# Altium schematic symbol library Minh_Lib.SchLib: 619 symbols (part 1 of 4) (continued)
## C0805C122K4RACTU
designator C?  Supplier Part Number 1: 80-C0805C122K4R
Cap Ceramic 0.0012uF/1200pF 16V X7R 10% SMD 0805 Paper T/R; Manufacturer: KEMET; Manufacturer Part Number: C0805C122K4RACTU; Capacitance: 1.2nF; Dissipation Factor: 5%; Supplier 1: Mouser; RoHS: Yes; Category: Ceramic Capacitors; Pricing 1: 1=0.25000, 10=0.17200, 50=0.17200, 100=0.09800, 1000=0.06100, 10000=0.04300 (USD); Mount: Surface Mount; Case/Package: 0805; Case Code (Imperial): 0805; Case Code (Metric): 2012; Dielectric Material: Ceramic; Min Operating Temperature: -55°C; Max Operating Temperature: 125°C; Package Quantity: 4000; Tolerance: 10%; Packaging: Tape and Reel; Voltage Rating: 16V; Voltage Rating (DC): 16V; Dielectric: X7R; Termination: SMD/SMT; Series: C; Length: 2mm; Width: 1.2mm; Height: 0.78mm; Lead Pitch: 0.75mm; Thickness: 0.035inch; Depth: 1.25mm; RoHS Compliant: Yes; ComponentLink1URL: http://www.mouser.com/ds/2/212/KEM_C1002_X7R_SMD-1102033.pdf?src-supplier=Mouser; ComponentLink1Description: http://www.mouser.com/ds/2/212/KEM_C1002_X7R_SMD-1102033.pdf?src-supplier=Mouser; ComponentLink2URL: https://search.kemet.com/component-edge/download/datasheet/C0805C122K4RACTU.pdf?src-supplier=Digi-Key; ComponentLink2Description: https://search.kemet.com/component-edge/download/datasheet/C0805C122K4RACTU.pdf?src-supplier=Digi-Key
footprint CAP0805
pins: 1, 2

## C0805C122K5RACTU
designator C?  Supplier Part Number 1: 66AH5612
Cap Ceramic 0.0012uF 50V X7R 10% SMD 0805 125C Plastic T/R; Manufacturer: KEMET; Manufacturer Part Number: C0805C122K5RACTU; Capacitance: 1.2nF; Dissipation Factor: 2.5%; Supplier 1: Newark; RoHS: Yes; Category: Ceramic Capacitors; Stock 1: 12000; Pricing 1: 4000=0.05700 (USD); Mount: Surface Mount; Case/Package: 0805; Dielectric Material: Ceramic; Case Code (Metric): 2012; Case Code (Imperial): 0805; Min Operating Temperature: -55°C; Max Operating Temperature: 125°C; Tolerance: 10%; Dielectric: X7R; Voltage Rating (DC): 50V; Packaging: Tape and Reel; Package Quantity: 1; Voltage Rating: 50V; Termination: SMD/SMT; Length: 2mm; Width: 0.049inch; Height: 0.78mm; Depth: 1.25mm; Thickness: 0.035inch; Lead Pitch: 0.75mm; Radiation Hardening: No; REACH SVHC: No SVHC; ComponentLink1URL: http://components.arrow.com/part/dataview/2091237S5303768N7429?src-supplier=Arrow+Electronics; ComponentLink1Description: http://components.arrow.com/part/dataview/2091237S5303768N7429?src-supplier=Arrow+Electronics; ComponentLink2URL: https://www.verical.com/server-webapp/html/getDatasheet?partID=548515&src-supplier=Verical; ComponentLink2Description: https://www.verical.com/server-webapp/html/getDatasheet?partID=548515&src-supplier=Verical; ComponentLink3URL: http://components.arrow.com/part/dataview/0323_00327402?src-supplier=Arrow+Europe; ComponentLink3Description: http://components.arrow.com/part/dataview/0323_00327402?src-supplier=Arrow+Europe; ComponentLink4URL: http://www.mouser.com/ds/2/212/KEM_C1002_X7R_SMD-1102033.pdf?src-supplier=Mouser; ComponentLink4Description: http://www.mouser.com/ds/2/212/KEM_C1002_X7R_SMD-1102033.pdf?src-supplier=Mouser; ComponentLink5URL: https://search.kemet.com/component-edge/download/datasheet/C0805C122K5RACTU.pdf?src-supplier=Digi-Key; ComponentLink5Description: https://search.kemet.com/component-edge/download/datasheet/C0805C122K5RACTU.pdf?src-supplier=Digi-Key; ComponentLink6URL: https://api.kemet.com/component-edge/download/datasheet/C0805C122K5RACTU.pdf?src-supplier=Digi-Key; ComponentLink6Description: https://api.kemet.com/component-edge/download/datasheet/C0805C122K5RACTU.pdf?src-supplier=Digi-Key; ComponentLink7URL: http://www.kemet.com/kemet/web/homepage/kechome.nsf/weben/C4DA2DA1D1C9D3C3CA2570A50016092D/$file/KEM_C1002_X7R_SMD.pdf?src-supplier=Avnet+Europe; ComponentLink7Description: http://www.kemet.com/kemet/web/homepage/kechome.nsf/weben/C4DA2DA1D1C9D3C3CA2570A50016092D/$file/KEM_C1002_X7R_SMD.pdf?src-supplier=Avnet+Europe; ComponentLink8URL: http://www.farnell.com/datasheets/2746341.pdf?src-supplier=Newark; ComponentLink8Description: http://www.farnell.com/datasheets/2746341.pdf?src-supplier=Newark
footprint CAP0805
pins: 1, 2

## C0805C122K8HACAUTO
designator C?  Supplier Part Number 1: 80-C0805C122K8HAUTO
Ceramic Capacitors - SMD/SMT 10V 1200pF X8R 0805 10% AEC-Q200; Manufacturer: KEMET; Manufacturer Part Number: C0805C122K8HACAUTO; Supplier 1: Mouser; RoHS: Yes; Category: Ceramic Capacitors; Pricing 1: 1=0.16000, 10=0.11300, 50=0.11300, 100=0.05400, 1000=0.03100, 10000=0.02400 (USD); RoHS Compliant: Yes
footprint CAP0805
pins: 1, 2

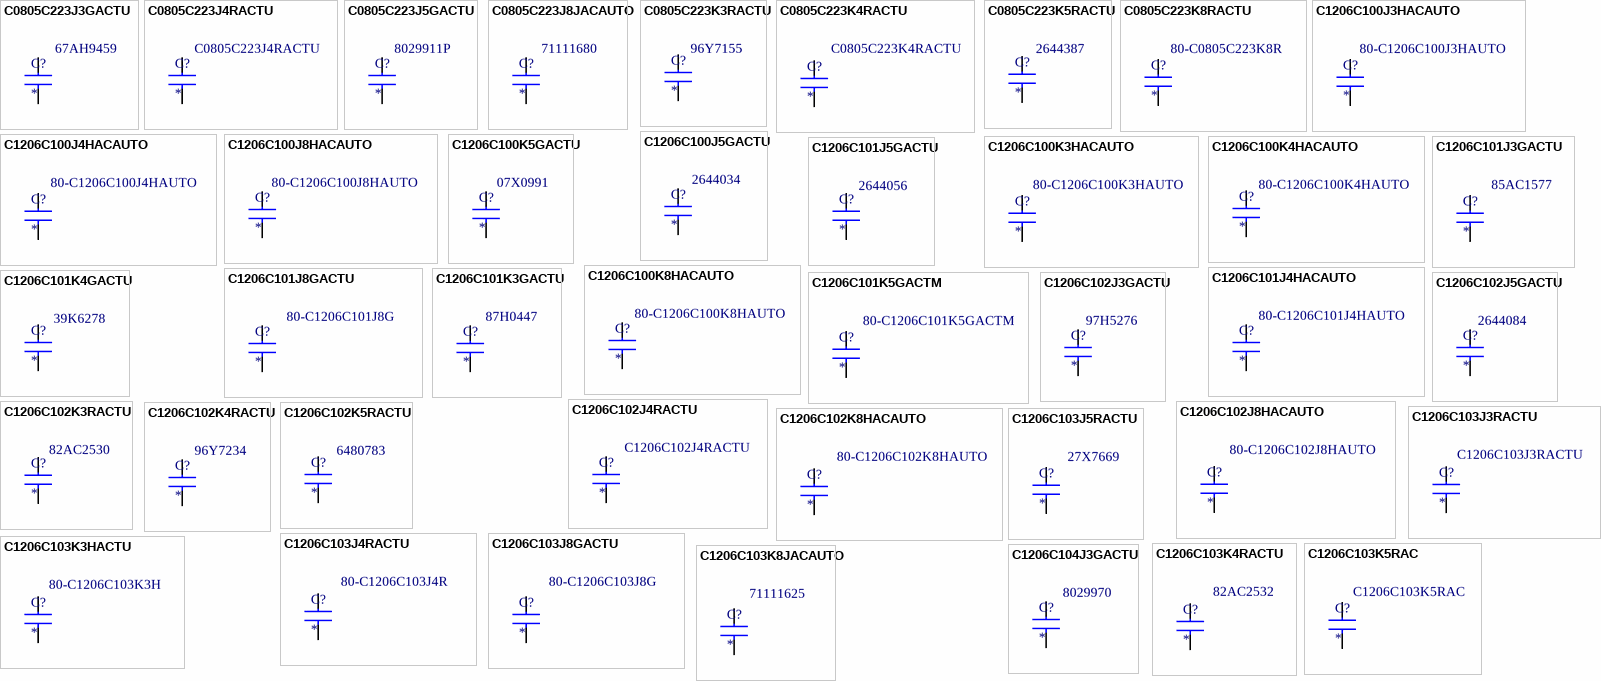
[diagram p2: symbols C0805C223J3GACTU to C1206C104J3GACTU]

## C0805C223J3GACTU
designator C?  Supplier Part Number 1: 67AH9459
Cap Ceramic 0.022uF 25V C0G 5% SMD 0805 125°C Paper T/R; Manufacturer: KEMET; Manufacturer Part Number: C0805C223J3GACTU; Capacitance: 22nF; Dissipation Factor: 0.1%; Supplier 1: Newark; RoHS: Yes; Category: Ceramic Capacitors; Stock 1: 12000; Pricing 1: 4000=0.18400, 8000=0.18100, 16000=0.17900 (USD); Mount: Surface Mount; Case/Package: 0805; Dielectric Material: Ceramic; Case Code (Imperial): 0805; Case Code (Metric): 2012; Min Operating Temperature: -55°C; Max Operating Temperature: 125°C; Tolerance: 5%; Voltage Rating (DC): 25V; Voltage Rating: 25V; Packaging: Tape and Reel; Dielectric: C0G; Package Quantity: 4000; Termination: SMD/SMT; Series: C0805C; Voltage: 25V; Construction: Flat; Length: 2mm; Width: 1.2mm; Height: 0.9mm; Thickness: 0.039inch; Depth: 1.25mm; Radiation Hardening: No; RoHS Compliant: Yes; Lead Free: Lead Free; REACH SVHC: No SVHC; ComponentLink1URL: http://components.arrow.com/part/dataview/0323_00071878?src-supplier=Arrow+Europe; ComponentLink1Description: http://components.arrow.com/part/dataview/0323_00071878?src-supplier=Arrow+Europe; ComponentLink2URL: http://www.farnell.com/datasheets/2741014.pdf?src-supplier=Farnell; ComponentLink2Description: http://www.farnell.com/datasheets/2741014.pdf?src-supplier=Farnell; ComponentLink3URL: http://www.mouser.com/ds/2/212/KEM_C1003_C0G_SMD-1101588.pdf?src-supplier=Mouser; ComponentLink3Description: http://www.mouser.com/ds/2/212/KEM_C1003_C0G_SMD-1101588.pdf?src-supplier=Mouser; ComponentLink4URL: http://components.arrow.com/part/dataview/46124259S8614547N7429?src-supplier=Arrow+Electronics; ComponentLink4Description: http://components.arrow.com/part/dataview/46124259S8614547N7429?src-supplier=Arrow+Electronics; ComponentLink5URL: http://www.farnell.com/datasheets/2741014.pdf?src-supplier=Element14; ComponentLink5Description: http://www.farnell.com/datasheets/2741014.pdf?src-supplier=Element14; ComponentLink6URL: https://www.verical.com/server-webapp/html/getDatasheet?partID=512137&src-supplier=Verical; ComponentLink6Description: https://www.verical.com/server-webapp/html/getDatasheet?partID=512137&src-supplier=Verical; ComponentLink7URL: https://api.kemet.com/component-edge/download/datasheet/C0805C223J3GACTU.pdf?src-supplier=Digi-Key; ComponentLink7Description: https://api.kemet.com/component-edge/download/datasheet/C0805C223J3GACTU.pdf?src-supplier=Digi-Key; ComponentLink8URL: http://www.farnell.com/datasheets/2741014.pdf?src-supplier=Newark; ComponentLink8Description: http://www.farnell.com/datasheets/2741014.pdf?src-supplier=Newark; ComponentLink9URL: http://www.kemet.com/docfinder?Partnumber=C0805C223J3GACTU&src-supplier=Digi-Key; ComponentLink9Description: http://www.kemet.com/docfinder?Partnumber=C0805C223J3GACTU&src-supplier=Digi-Key; ComponentLink10URL: http://capacitoredge.kemet.com/capedge2/DataSheet?pn=C0805C223J3GACTU&src-supplier=Avnet; ComponentLink10Description: http://capacitoredge.kemet.com/capedge2/DataSheet?pn=C0805C223J3GACTU&src-supplier=Avnet
footprint CAP0805
pins: 1, 2

## C0805C223J4RACTU
designator C?  Supplier Part Number 1: C0805C223J4RACTU
Cap Ceramic 0.022uF 16V X7R 5% Pad SMD 0805 125C T/R; Manufacturer: KEMET; Supplier 1: Arrow Electronics; Manufacturer Part Number: C0805C223J4RACTU; RoHS: Yes; Category: Ceramic Capacitors; Stock 1: 3451; Pricing 1: 1=0.15480, 10=0.09600, 25=0.09500, 50=0.09410, 100=0.06120, 250=0.06060, 500=0.05680, 1000=0.05300, 3000=0.04920 (USD); RoHS Compliant: Yes
footprint CAP0805
pins: 1, 2

## C0805C223J5GACTU
designator C?  Supplier Part Number 1: 8029911P
Ceramic Capacitors MLCC - SMD/SMT 50V 0.022uF C0G 0805 5%; Manufacturer: KEMET; Manufacturer Part Number: C0805C223J5GACTU; Capacitance: 22nF; Dissipation Factor: 0.1%; Temperature Coefficient: 30ppm/°C; Supplier 1: RSComponents; RoHS: Yes; Category: Ceramic Capacitors; Stock 1: 1; Pricing 1: 25=0.58100, 250=0.39800, 1250=0.26200, 2500=0.22900 (USD); Mount: Surface Mount; Case/Package: 0805; Number of Pins: 2; Dielectric Material: Ceramic; Case Code (Imperial): 0805; Case Code (Metric): 2012; Min Operating Temperature: -55°C; Max Operating Temperature: 125°C; Tolerance: 5%; Packaging: Tape and Reel; Dielectric: C0G; Voltage Rating (DC): 50V; Voltage Rating: 50V; Series: -; Termination: SMD/SMT; Package Quantity: 1; Voltage: 50V; Construction: Flat; Length: 2mm; Width: 0.049inch; Height: 1.1mm; Depth: 1.25mm; Thickness: 0.047inch; Radiation Hardening: No; RoHS Compliant: Yes; REACH SVHC: No SVHC; Lead Free: Lead Free; ComponentLink1URL: https://datasheet.ciiva.com/5418/kem-c1003-c0g-smd-356956-5418138.pdf?src-supplier=Mouser; ComponentLink1Description: https://datasheet.ciiva.com/5418/kem-c1003-c0g-smd-356956-5418138.pdf?src-supplier=Mouser
footprint CAP0805
pins: 1, 2

## C0805C223J8JACAUTO
designator C?  Supplier Part Number 1: 71111680
Ceramic Capacitors MLCC - SMD 10V 0.022uF U2J 0805 5% AEC-Q200; Manufacturer: KEMET; Manufacturer Part Number: C0805C223J8JACAUTO; Supplier 1: Allied Electronics; RoHS: Yes; Category: Ceramic Capacitors; Pricing 1: 4000=0.10100, 200000=0.09900 (USD); RoHS Compliant: Yes; ComponentLink1URL: https://api.kemet.com/component-edge/download/datasheet/C0805C223J8JACAUTO.pdf?src-supplier=Digi-Key; ComponentLink1Description: https://api.kemet.com/component-edge/download/datasheet/C0805C223J8JACAUTO.pdf?src-supplier=Digi-Key
footprint CAP0805
pins: 1, 2

## C0805C223K3RACTU
designator C?  Supplier Part Number 1: 96Y7155
Cap Ceramic 0.022uF 25V X7R 10% SMD 0805 125°C Paper T/R; Manufacturer: KEMET; Manufacturer Part Number: C0805C223K3RACTU; Capacitance: 22nF; Dissipation Factor: 3.5%; Supplier 1: Newark; RoHS: Yes; Category: Ceramic Capacitors; Stock 1: 2359; Pricing 1: 1=0.03200, 25=0.03200, 50=0.03200, 100=0.03200, 250=0.03200, 500=0.03200, 1000=0.03200 (USD); Mount: Surface Mount; Case/Package: 0805; Case Code (Imperial): 0805; Case Code (Metric): 2012; Dielectric Material: Ceramic; Min Operating Temperature: -55°C; Max Operating Temperature: 125°C; Tolerance: 10%; Dielectric: X7R; Packaging: Tape and Reel; Voltage Rating (DC): 25V; Termination: SMD/SMT; Series: -; Package Quantity: 1; Voltage Rating: 25V; Construction: Flat; Length: 2mm; Width: 1.2mm; Height: 0.78mm; Depth: 1.25mm; Thickness: 0.039inch; Lead Pitch: 0.75mm; Radiation Hardening: No; RoHS Compliant: Yes; ComponentLink1URL: http://www.mouser.com/ds/2/212/KEM_C1002_X7R_SMD-1102033.pdf?src-supplier=Mouser; ComponentLink1Description: http://www.mouser.com/ds/2/212/KEM_C1002_X7R_SMD-1102033.pdf?src-supplier=Mouser; ComponentLink2URL: http://components.arrow.com/part/dataview/0323_00328799?src-supplier=Arrow+Europe; ComponentLink2Description: http://components.arrow.com/part/dataview/0323_00328799?src-supplier=Arrow+Europe; ComponentLink3URL: http://components.arrow.com/part/dataview/2091757S5955627N7429?src-supplier=Arrow+Electronics; ComponentLink3Description: http://components.arrow.com/part/dataview/2091757S5955627N7429?src-supplier=Arrow+Electronics; ComponentLink4URL: https://api.kemet.com/component-edge/download/datasheet/C0805C223K3RACTU.pdf?src-supplier=Digi-Key; ComponentLink4Description: https://api.kemet.com/component-edge/download/datasheet/C0805C223K3RACTU.pdf?src-supplier=Digi-Key; ComponentLink5URL: http://www.kemet.com/docfinder?Partnumber=C0805C223K3RACTU&src-supplier=Digi-Key; ComponentLink5Description: http://www.kemet.com/docfinder?Partnumber=C0805C223K3RACTU&src-supplier=Digi-Key
footprint CAP0805
pins: 1, 2

## C0805C223K4RACTU
designator C?  Supplier Part Number 1: C0805C223K4RACTU
Capacitor, Ceramic, 22nF, 16VDC, 10-% Tol, 10+% Tol, X7R-TC Code, -15, 15%-TC RoHS Compliant: Yes; Manufacturer: KEMET; Tolerance: 10%; Voltage Rating: 16V; Dielectric: X7R; Dissipation Factor: 5%; Supplier 1: Arrow Electronics; Manufacturer Part Number: C0805C223K4RACTU; RoHS: Yes; Category: Ceramic Capacitors; Stock 1: 3909; Pricing 1: 1=0.31960, 10=0.20270, 25=0.20070, 100=0.12030, 250=0.11910, 500=0.08390, 1000=0.07460, 3000=0.07380 (USD); Mount: Surface Mount; Case/Package: 0805; Dielectric Material: Ceramic; Case Code (Imperial): 0805; Case Code (Metric): 2012; Min Operating Temperature: -55°C; Max Operating Temperature: 125°C; Capacitance: 22nF; Packaging: Tape and Reel; Voltage Rating (DC): 16V; Package Quantity: 4000; Termination: SMD/SMT; Series: C; Length: 2mm; Width: 1.2mm; Height: 0.78mm; Thickness: 0.035inch; Depth: 1.25mm; Lead Pitch: 0.75mm; RoHS Compliant: Yes; ComponentLink1URL: http://components.arrow.com/part/dataview/3451348S8614565N7429?src-supplier=Arrow+Electronics; ComponentLink1Description: http://components.arrow.com/part/dataview/3451348S8614565N7429?src-supplier=Arrow+Electronics; ComponentLink2URL: http://www.mouser.com/ds/2/212/KEM_C1002_X7R_SMD-1102033.pdf?src-supplier=Mouser; ComponentLink2Description: http://www.mouser.com/ds/2/212/KEM_C1002_X7R_SMD-1102033.pdf?src-supplier=Mouser; ComponentLink3URL: http://www.farnell.com/datasheets/2682884.pdf?src-supplier=Farnell; ComponentLink3Description: http://www.farnell.com/datasheets/2682884.pdf?src-supplier=Farnell; ComponentLink4URL: http://www.kemet.com/docfinder?Partnumber=C0805C223K4RACTU&src-supplier=Digi-Key; ComponentLink4Description: http://www.kemet.com/docfinder?Partnumber=C0805C223K4RACTU&src-supplier=Digi-Key
footprint CAP0805
pins: 1, 2

## C0805C223K5RACTU
designator C?  Supplier Part Number 1: 2644387
Cap Ceramic 0.022uF 50V X7R 10% SMD 0805 125C Plastic T/R; Manufacturer: KEMET; Manufacturer Part Number: C0805C223K5RACTU; Capacitance: 22nF; Supplier 1: RSComponents; RoHS: Yes; Category: Ceramic Capacitors; Stock 1: 10025; Pricing 1: 25=0.05400, 100=0.05100, 250=0.04700, 500=0.04400, 1250=0.04000 (USD); Mount: Surface Mount,PCB; Case/Package: 0805; Dielectric Material: Ceramic; Case Code (Imperial): 0805; Case Code (Metric): 2012; Weight: 0.000194oz; Min Operating Temperature: -55°C; Max Operating Temperature: 125°C; Packaging: Tape and Reel; Tolerance: 10%; Voltage Rating (DC): 50V; Dielectric: X7R; Series: C0805C; Termination: SMD/SMT; Voltage Rating: 50V; Construction: Flat; Voltage: 50V; Length: 2mm; Width: 1.2mm; Height: 0.78mm; Depth: 1.25mm; Radiation Hardening: No; RoHS Compliant: Yes; REACH SVHC: No SVHC; ComponentLink1URL: https://datasheet.ciiva.com/18193/getdatasheetpartid-385695-18193669.pdf?src-supplier=Verical; ComponentLink1Description: https://datasheet.ciiva.com/18193/getdatasheetpartid-385695-18193669.pdf?src-supplier=Verical
footprint CAP0805
pins: 1, 2

## C0805C223K8RACTU
designator C?  Supplier Part Number 1: 80-C0805C223K8R
Ceramic Capacitors MLCC - SMD/SMT 10V 0.022uF X7R 0805 10%; Manufacturer: KEMET; Manufacturer Part Number: C0805C223K8RACTU; Capacitance: 22nF; Supplier 1: Mouser; RoHS: Yes; Category: Ceramic Capacitors; Stock 1: 3365; Pricing 1: 1=0.36000, 10=0.19200, 50=0.19200, 100=0.12000, 1000=0.09000, 10000=0.07000 (USD); Mount: Surface Mount; Case/Package: 0805; Dielectric Material: Ceramic; Case Code (Metric): 2012; Case Code (Imperial): 0805; Min Operating Temperature: -55°C; Max Operating Temperature: 125°C; Tolerance: 10%; Packaging: Tape and Reel; Voltage Rating: 10V; Voltage Rating (DC): 10V; Dielectric: X7R; Package Quantity: 4000; Termination: SMD/SMT; Series: C; Length: 2mm; Width: 0.049inch; Thickness: 0.035inch; Depth: 1.25mm; RoHS Compliant: Yes; ComponentLink1URL: http://www.mouser.com/ds/2/212/KEM_C1002_X7R_SMD-1102033.pdf?src-supplier=Mouser; ComponentLink1Description: http://www.mouser.com/ds/2/212/KEM_C1002_X7R_SMD-1102033.pdf?src-supplier=Mouser; ComponentLink2URL: http://components.arrow.com/part/dataview/3451337S8614568N7429?src-supplier=Arrow+Electronics; ComponentLink2Description: http://components.arrow.com/part/dataview/3451337S8614568N7429?src-supplier=Arrow+Electronics; ComponentLink3URL: https://search.kemet.com/component-edge/download/datasheet/C0805C223K8RACTU.pdf?src-supplier=Digi-Key; ComponentLink3Description: https://search.kemet.com/component-edge/download/datasheet/C0805C223K8RACTU.pdf?src-supplier=Digi-Key
footprint CAP0805
pins: 1, 2

## C1206C100J3HACAUTO
designator C?  Supplier Part Number 1: 80-C1206C100J3HAUTO
Cap Cer 1206 10PF 25V Ultra Stab; Manufacturer: KEMET; Manufacturer Part Number: C1206C100J3HACAUTO; Supplier 1: Mouser; RoHS: Yes; Category: Ceramic Capacitors; Pricing 1: 1=0.19000, 10=0.12900, 50=0.12900, 100=0.06600, 1000=0.04000, 10000=0.03200 (USD); RoHS Compliant: Yes
footprint CAP1206
pins: 1, 2

## C1206C100J4HACAUTO
designator C?  Supplier Part Number 1: 80-C1206C100J4HAUTO
Cap Cer 1206 10PF 16V Ultra Stab; Manufacturer: KEMET; Manufacturer Part Number: C1206C100J4HACAUTO; Supplier 1: Mouser; RoHS: Yes; Category: Ceramic Capacitors; Pricing 1: 1=0.19000, 10=0.12900, 50=0.12900, 100=0.06600, 1000=0.04000, 10000=0.03200 (USD)
footprint CAP1206
pins: 1, 2

## C1206C100J5GACTU
designator C?  Supplier Part Number 1: 2644034
1206 10pF Ceramic Multilayer Capacitor; 50VDC; 125degC; C0G Dielec; +/-5% SMD; Manufacturer: KEMET; Manufacturer Part Number: C1206C100J5GACTU; Tolerance: 5%; Voltage Rating (DC): 50V; Voltage: 63V; Dissipation Factor: 0.1%; Temperature Coefficient: 30ppm/°C; Supplier 1: RSComponents; RoHS: Yes; Category: Ceramic Capacitors; Stock 1: 1; Pricing 1: 25=0.15300, 500=0.12900, 1000=0.11600, 2500=0.10000, 5000=0.09100 (USD); Mount: Surface Mount,PCB; Case/Package: 1206; Dielectric Material: Ceramic; Case Code (Metric): 3216; Case Code (Imperial): 1206; Contact Material: Tin; Min Operating Temperature: -55°C; Max Operating Temperature: 125°C; Capacitance: 10pF; Dielectric: C0G; Packaging: Tape and Reel; Package Quantity: 1; Voltage Rating: 50V; Termination: SMD/SMT; Series: C; Construction: Flat; Length: 3.2mm; Width: 0.063inch; Height: 0.78mm; Depth: 1.6mm; Thickness: 0.035inch; Radiation Hardening: No; RoHS Compliant: Yes; Lead Free: Lead Free; REACH SVHC: No SVHC; ComponentLink1URL: https://datasheet.ciiva.com/145/docfinderpartnumber-c1206c100j5gactu-145616.pdf?src-supplier=Digi-Key; ComponentLink1Description: https://datasheet.ciiva.com/145/docfinderpartnumber-c1206c100j5gactu-145616.pdf?src-supplier=Digi-Key; ComponentLink2URL: https://datasheet.ciiva.com/7729/1691965-7729759.pdf?src-supplier=Element14; ComponentLink2Description: https://datasheet.ciiva.com/7729/1691965-7729759.pdf?src-supplier=Element14; ComponentLink3URL: https://datasheet.ciiva.com/14589/70095383-14589095.pdf?src-supplier=Allied+Electronics; ComponentLink3Description: https://datasheet.ciiva.com/14589/70095383-14589095.pdf?src-supplier=Allied+Electronics; ComponentLink4URL: https://datasheet.ciiva.com/5414/kem-c1003-c0g-smd-356956-5414231.pdf?src-supplier=Mouser; ComponentLink4Description: https://datasheet.ciiva.com/5414/kem-c1003-c0g-smd-356956-5414231.pdf?src-supplier=Mouser; ComponentLink5URL: https://datasheet.ciiva.com/18194/getdatasheetpartid-330949-18194039.pdf?src-supplier=Verical; ComponentLink5Description: https://datasheet.ciiva.com/18194/getdatasheetpartid-330949-18194039.pdf?src-supplier=Verical; ComponentLink6URL: https://datasheet.ciiva.com/18194/getdatasheetpartid-92660-18194043.pdf?src-supplier=Verical; ComponentLink6Description: https://datasheet.ciiva.com/18194/getdatasheetpartid-92660-18194043.pdf?src-supplier=Verical
footprint CAP1206
pins: 1, 2

## C1206C100J8HACAUTO
designator C?  Supplier Part Number 1: 80-C1206C100J8HAUTO
Cap Cer 1206 10PF 10V Ultra Stab; Manufacturer: KEMET; Manufacturer Part Number: C1206C100J8HACAUTO; Supplier 1: Mouser; RoHS: Yes; Category: Ceramic Capacitors; Pricing 1: 1=0.19000, 10=0.12900, 50=0.12900, 100=0.06600, 1000=0.04000, 10000=0.03200 (USD); RoHS Compliant: Yes
footprint CAP1206
pins: 1, 2

## C1206C100K3HACAUTO
designator C?  Supplier Part Number 1: 80-C1206C100K3HAUTO
Cap Cer 1206 10PF 25V Ultra Stab; Manufacturer: KEMET; Manufacturer Part Number: C1206C100K3HACAUTO; Supplier 1: Mouser; RoHS: Yes; Category: Ceramic Capacitors; Pricing 1: 1=0.21000, 10=0.14700, 50=0.14700, 100=0.07000, 1000=0.04100, 10000=0.03100 (USD); RoHS Compliant: Yes
footprint CAP1206
pins: 1, 2

## C1206C100K4HACAUTO
designator C?  Supplier Part Number 1: 80-C1206C100K4HAUTO
Cap Cer 1206 10PF 16V Ultra Stab; Manufacturer: KEMET; Manufacturer Part Number: C1206C100K4HACAUTO; Supplier 1: Mouser; RoHS: Yes; Category: Ceramic Capacitors; Pricing 1: 1=0.21000, 10=0.14700, 50=0.14700, 100=0.07000, 1000=0.04100, 10000=0.03100 (USD); RoHS Compliant: Yes
footprint CAP1206
pins: 1, 2

## C1206C100K5GACTU
designator C?  Supplier Part Number 1: 07X0991
Cap Ceramic 10pF 50V C0G 10% SMD 1206 125°C Plastic T/R; Manufacturer: KEMET; Manufacturer Part Number: C1206C100K5GACTU; Dissipation Factor: 0.1%; Supplier 1: Newark; RoHS: Yes; Category: Ceramic Capacitors; Stock 1: 52; Pricing 1: 1=0.00500, 25=0.00500, 50=0.00500, 100=0.00500, 250=0.00500, 500=0.00500 (USD); Mount: Surface Mount; Case/Package: 1206; Dielectric Material: Ceramic; Case Code (Metric): 3216; Case Code (Imperial): 1206; Min Operating Temperature: -55°C; Max Operating Temperature: 125°C; Capacitance: 10pF; Tolerance: 10%; Dielectric: C0G; Packaging: Tape and Reel; Voltage Rating (DC): 50V; Package Quantity: 1; Voltage Rating: 50V; Termination: SMD/SMT; Series: C; Length: 3.2mm; Width: 0.063inch; Height: 0.78mm; Depth: 1.6mm; Thickness: 0.035inch; RoHS Compliant: Yes; Lead Free: Lead Free; REACH SVHC: No SVHC; ComponentLink1URL: https://datasheet.ciiva.com/7600/1828801-7600039.pdf?src-supplier=Newark; ComponentLink1Description: https://datasheet.ciiva.com/7600/1828801-7600039.pdf?src-supplier=Newark
footprint CAP1206
pins: 1, 2

## C1206C100K8HACAUTO
designator C?  Supplier Part Number 1: 80-C1206C100K8HAUTO
Cap Cer 1206 10PF 10V Ultra Stab; Manufacturer: KEMET; Manufacturer Part Number: C1206C100K8HACAUTO; Supplier 1: Mouser; RoHS: Yes; Category: Ceramic Capacitors; Pricing 1: 1=0.21000, 10=0.14700, 50=0.14700, 100=0.07000, 1000=0.04100, 10000=0.03100 (USD); RoHS Compliant: Yes
footprint CAP1206
pins: 1, 2

## C1206C101J3GACTU
designator C?  Supplier Part Number 1: 85AC1577
Cap Ceramic 100pF 25V C0G 5% SMD 1206 125°C Paper T/R; Manufacturer: KEMET; Manufacturer Part Number: C1206C101J3GACTU; Supplier 1: Newark; RoHS: Yes; Category: Ceramic Capacitors; Stock 1: 2735; Pricing 1: 10=0.26000, 25=0.22300, 50=0.18500, 100=0.14800 (USD); Case/Package: 1206; Case Code (Imperial): 1206; Case Code (Metric): 3216; Weight: 0.000571oz; Dielectric Material: Ceramic; Min Operating Temperature: -55°C; Max Operating Temperature: 125°C; Capacitance: 100pF; Voltage Rating (DC): 25V; Tolerance: 5%; Packaging: Tape and Reel; Dielectric: C0G; Termination: SMD/SMT; Series: C1206C; Length: 3.2mm; Width: 1.6mm; Height: 0.78mm; RoHS Compliant: Yes; Lead Free: Lead Free; ComponentLink1URL: http://www.farnell.com/datasheets/2750478.pdf?src-supplier=Farnell; ComponentLink1Description: http://www.farnell.com/datasheets/2750478.pdf?src-supplier=Farnell; ComponentLink2URL: http://www.mouser.com/ds/2/212/KEM_C1003_C0G_SMD-1101588.pdf?src-supplier=Mouser; ComponentLink2Description: http://www.mouser.com/ds/2/212/KEM_C1003_C0G_SMD-1101588.pdf?src-supplier=Mouser; ComponentLink3URL: http://www.farnell.com/datasheets/2750478.pdf?src-supplier=Newark; ComponentLink3Description: http://www.farnell.com/datasheets/2750478.pdf?src-supplier=Newark
footprint CAP1206
pins: 1, 2

## C1206C101J4HACAUTO
designator C?  Supplier Part Number 1: 80-C1206C101J4HAUTO
Cap Cer 1206 100PF 16V Ultra Sta; Manufacturer: KEMET; Manufacturer Part Number: C1206C101J4HACAUTO; Supplier 1: Mouser; RoHS: Yes; Category: Ceramic Capacitors; Pricing 1: 1=0.20000, 10=0.13600, 50=0.13600, 100=0.07000, 1000=0.04200, 10000=0.03400 (USD); RoHS Compliant: Yes
footprint CAP1206
pins: 1, 2

## C1206C101J5GACTU
designator C?  Supplier Part Number 1: 2644056
Cap Ceramic 100pF 50V C0G 5% SMD 1206 125C Paper T/R; Manufacturer: KEMET; Manufacturer Part Number: C1206C101J5GACTU; Dissipation Factor: 0.1%; Temperature Coefficient: 30ppm/°C; Supplier 1: RSComponents; RoHS: Yes; Category: Ceramic Capacitors; Stock 1: 1; Pricing 1: 25=0.19600, 250=0.07000, 625=0.06600, 1250=0.05800, 2500=0.05500 (USD); Mount: Surface Mount,PCB; Case/Package: 1206; Case Code (Metric): 3216; Case Code (Imperial): 1206; Dielectric Material: Ceramic; Contact Material: Tin; Contact Plating: Tin,Matte; Min Operating Temperature: -55°C; Max Operating Temperature: 125°C; Capacitance: 100pF; Tolerance: 5%; Dielectric: C0G; Voltage Rating (DC): 50V; Packaging: Tape and Reel; Termination: SMD/SMT; Series: C; Package Quantity: 1; Voltage Rating: 50V; Voltage: 50V; Construction: Flat; Length: 3.2mm; Width: 0.063inch; Height: 0.78mm; Depth: 1.6mm; Thickness: 0.035inch; Radiation Hardening: No; RoHS Compliant: Yes; Lead Free: Lead Free; REACH SVHC: No SVHC; ComponentLink1URL: https://datasheet.ciiva.com/145/docfinderpartnumber-c1206c101j5gactu-145584.pdf?src-supplier=Digi-Key; ComponentLink1Description: https://datasheet.ciiva.com/145/docfinderpartnumber-c1206c101j5gactu-145584.pdf?src-supplier=Digi-Key; ComponentLink2URL: https://datasheet.ciiva.com/7729/1691965-7729768.pdf?src-supplier=Element14; ComponentLink2Description: https://datasheet.ciiva.com/7729/1691965-7729768.pdf?src-supplier=Element14; ComponentLink3URL: https://datasheet.ciiva.com/7729/1691965-7729767.pdf?src-supplier=Element14; ComponentLink3Description: https://datasheet.ciiva.com/7729/1691965-7729767.pdf?src-supplier=Element14; ComponentLink4URL: https://datasheet.ciiva.com/28688/1789732-28688680.pdf?src-supplier=Element14; ComponentLink4Description: https://datasheet.ciiva.com/28688/1789732-28688680.pdf?src-supplier=Element14; ComponentLink5URL: https://datasheet.ciiva.com/14589/70095383-14589515.pdf?src-supplier=Allied+Electronics; ComponentLink5Description: https://datasheet.ciiva.com/14589/70095383-14589515.pdf?src-supplier=Allied+Electronics; ComponentLink6URL: https://datasheet.ciiva.com/5414/kem-c1003-c0g-smd-356956-5414031.pdf?src-supplier=Mouser; ComponentLink6Description: https://datasheet.ciiva.com/5414/kem-c1003-c0g-smd-356956-5414031.pdf?src-supplier=Mouser; ComponentLink7URL: https://datasheet.ciiva.com/2988/kem-c1003-c0g-smd-2988704.pdf?src-supplier=Avnet; ComponentLink7Description: https://datasheet.ciiva.com/2988/kem-c1003-c0g-smd-2988704.pdf?src-supplier=Avnet; ComponentLink8URL: https://datasheet.ciiva.com/2988/kem-c1003-c0g-smd-2988705.pdf?src-supplier=Avnet; ComponentLink8Description: https://datasheet.ciiva.com/2988/kem-c1003-c0g-smd-2988705.pdf?src-supplier=Avnet
footprint CAP1206
pins: 1, 2

## C1206C101J8GACTU
designator C?  Supplier Part Number 1: 80-C1206C101J8G
Cap, 100PF, 10V, Mlcc, 1206; Manufacturer: KEMET; Manufacturer Part Number: C1206C101J8GACTU; Tolerance: 5%; Dielectric: C0G; Dissipation Factor: 0.1%; Supplier 1: Mouser; RoHS: Yes; Category: Ceramic Capacitors; Stock 1: 3152; Pricing 1: 1=0.40000, 10=0.27100, 50=0.27100, 100=0.16300, 1000=0.11400, 10000=0.09200 (USD); Case/Package: 1206; Case Code (Imperial): 1206; Case Code (Metric): 3216; Min Operating Temperature: -55°C; Max Operating Temperature: 125°C; Voltage Rating: 10V; Capacitance: 100pF; Voltage Rating (DC): 10V; Packaging: Tape and Reel; Package Quantity: 4000; Termination: SMD/SMT; Length: 3.2mm; Width: 1.6mm; Height: 0.78mm; ComponentLink1URL: http://www.mouser.com/ds/2/212/KEM_C1003_C0G_SMD-1101588.pdf?src-supplier=Mouser; ComponentLink1Description: http://www.mouser.com/ds/2/212/KEM_C1003_C0G_SMD-1101588.pdf?src-supplier=Mouser
footprint CAP1206
pins: 1, 2

## C1206C101K3GACTU
designator C?  Supplier Part Number 1: 87H0447
Capacitor, Ceramic, 100pF, 25VDC, 10-% Tol, 10+% Tol, C0G-TC Code, -30, 30ppm-TC RoHS Compliant: Yes; Manufacturer: KEMET; Manufacturer Part Number: C1206C101K3GACTU; Tolerance: 10%; Dielectric: C0G; Voltage Rating (DC): 25V; Supplier 1: Newark; RoHS: Yes; Category: Ceramic Capacitors; Pricing 1: 4000=0.08900 (USD); Mount: Surface Mount; Case/Package: 1206; Dielectric Material: Ceramic; Case Code (Metric): 3216; Case Code (Imperial): 1206; Weight: 0.000571oz; Min Operating Temperature: -55°C; Max Operating Temperature: 125°C; Capacitance: 100pF; Packaging: Tape and Reel; Package Quantity: 4000; Voltage Rating: 25V; Termination: SMD/SMT; Series: C; Length: 3.2mm; Width: 0.063inch; Height: 0.78mm; Depth: 1.6mm; Thickness: 0.035inch; RoHS Compliant: Yes; Lead Free: Lead Free; ComponentLink1URL: https://datasheet.ciiva.com/5438/kem-c1003-c0g-smd-356956-5438763.pdf?src-supplier=Mouser; ComponentLink1Description: https://datasheet.ciiva.com/5438/kem-c1003-c0g-smd-356956-5438763.pdf?src-supplier=Mouser
footprint CAP1206
pins: 1, 2

## C1206C101K4GACTU
designator C?  Supplier Part Number 1: 39K6278
Capacitor, Ceramic, 100pF, 16VDC, 10-% Tol, 10+% Tol, C0G-TC Code, -30, 30ppm-TC RoHS Compliant: Yes; Manufacturer: KEMET; Manufacturer Part Number: C1206C101K4GACTU; Tolerance: 10%; Dielectric: C0G; Voltage Rating (DC): 16V; Supplier 1: Newark; RoHS: Yes; Category: Ceramic Capacitors; Pricing 1: 4000=0.08300 (USD); Mount: Surface Mount; Case/Package: 1206; Dielectric Material: Ceramic; Min Operating Temperature: -55°C; Max Operating Temperature: 125°C; Capacitance: 100pF; Package Quantity: 4000; Voltage Rating: 16V; Packaging: Tape and Reel; Series: C; Length: 0.126inch; Width: 0.063inch; Depth: 1.6mm; Thickness: 0.035inch; RoHS Compliant: Yes; Lead Free: Lead Free; ComponentLink1URL: http://components.arrow.com/part/dataview/30770671S9599977N7429?src-supplier=Arrow+Electronics; ComponentLink1Description: http://components.arrow.com/part/dataview/30770671S9599977N7429?src-supplier=Arrow+Electronics; ComponentLink2URL: https://search.kemet.com/component-edge/download/datasheet/C1206C101K4GACTU.pdf?src-supplier=Digi-Key; ComponentLink2Description: https://search.kemet.com/component-edge/download/datasheet/C1206C101K4GACTU.pdf?src-supplier=Digi-Key; ComponentLink3URL: http://www.kemet.com/Lists/ProductCatalog/Attachments/46/KEM_C1003_C0G_SMD.pdf?src-supplier=Avnet; ComponentLink3Description: http://www.kemet.com/Lists/ProductCatalog/Attachments/46/KEM_C1003_C0G_SMD.pdf?src-supplier=Avnet
footprint CAP1206
pins: 1, 2

## C1206C101K5GACTM
designator C?  Supplier Part Number 1: 80-C1206C101K5GACTM
Multilayer Ceramic Capacitors MLCC - SMD/SMT 50volts 100pF C0G 10%; Manufacturer: KEMET; Manufacturer Part Number: C1206C101K5GACTM; Voltage Rating (DC): 50V; Supplier 1: Mouser; RoHS: Yes; Category: Capacitors; Case/Package: 1206; Dielectric Material: Ceramic; Case Code (Imperial): 1206; Case Code (Metric): 3216; Weight: 0.000571oz; Min Operating Temperature: -55°C; Max Operating Temperature: 125°C; Capacitance: 100pF; Tolerance: 10%; Dielectric: C0G; Packaging: Tape and Reel; Termination: SMD/SMT; Length: 3.2mm; Width: 1.6mm; Height: 0.78mm; Lead Free: Lead Free; ComponentLink1URL: http://www.mouser.com/ds/2/212/KEM_C1003_C0G_SMD-1101588.pdf?src-supplier=Mouser; ComponentLink1Description: http://www.mouser.com/ds/2/212/KEM_C1003_C0G_SMD-1101588.pdf?src-supplier=Mouser
footprint CAP1206
pins: 1, 2

## C1206C102J3GACTU
designator C?  Supplier Part Number 1: 97H5276
Capacitor, ceramic, 1Nf, 25Vdc, 5-% Tol, 5+% Tol, c0G-Tc Code, -30, 30Ppm-Tc Rohs Compliant: Yes; Manufacturer: KEMET; Manufacturer Part Number: C1206C102J3GACTU; Tolerance: 5%; Dielectric: C0G; Voltage Rating: 25V; Supplier 1: Newark; RoHS: Yes; Category: Ceramic Capacitors; Pricing 1: 4000=0.13100 (USD); Mount: Surface Mount; Case/Package: 1206; Case Code (Metric): 3216; Case Code (Imperial): 1206; Dielectric Material: Ceramic; Weight: 0.000571oz; Min Operating Temperature: -55°C; Max Operating Temperature: 125°C; Capacitance: 1nF; Packaging: Tape and Reel; Voltage Rating (DC): 25V; Package Quantity: 4000; Termination: SMD/SMT; Series: C1206C; Length: 3.2mm; Width: 0.063inch; Height: 0.78mm; Depth: 1.6mm; Thickness: 0.035inch; RoHS Compliant: Yes; Lead Free: Lead Free; ComponentLink1URL: http://www.mouser.com/ds/2/212/KEM_C1003_C0G_SMD-1101588.pdf?src-supplier=Mouser; ComponentLink1Description: http://www.mouser.com/ds/2/212/KEM_C1003_C0G_SMD-1101588.pdf?src-supplier=Mouser; ComponentLink2URL: http://components.arrow.com/part/dataview/30770819S9726452N7429?src-supplier=Arrow+Electronics; ComponentLink2Description: http://components.arrow.com/part/dataview/30770819S9726452N7429?src-supplier=Arrow+Electronics; ComponentLink3URL: https://search.kemet.com/component-edge/download/datasheet/C1206C102J3GACTU.pdf?src-supplier=Digi-Key; ComponentLink3Description: https://search.kemet.com/component-edge/download/datasheet/C1206C102J3GACTU.pdf?src-supplier=Digi-Key; ComponentLink4URL: http://www.kemet.com/Lists/ProductCatalog/Attachments/46/KEM_C1003_C0G_SMD.pdf?src-supplier=Avnet; ComponentLink4Description: http://www.kemet.com/Lists/ProductCatalog/Attachments/46/KEM_C1003_C0G_SMD.pdf?src-supplier=Avnet
footprint CAP1206
pins: 1, 2

## C1206C102J4RACTU
designator C?  Supplier Part Number 1: C1206C102J4RACTU
Cap Ceramic 0.001uF 16V X7R 5% Pad SMD 1206 125C T/R; Manufacturer: KEMET; Capacitance: 1nF; Supplier 1: Arrow Electronics; Manufacturer Part Number: C1206C102J4RACTU; RoHS: Yes; Category: Ceramic Capacitors; Stock 1: 579; Pricing 1: 1=0.44140, 10=0.30680, 100=0.18240, 500=0.13500, 1000=0.11330, 4000=0.10030 (USD); Case/Package: 1206; Dielectric Material: Ceramic; Tolerance: 5%; Voltage Rating (DC): 16V; Dielectric: X7R; RoHS Compliant: Yes
footprint CAP1206
pins: 1, 2

## C1206C102J5GACTU
designator C?  Supplier Part Number 1: 2644084
1206 1000pF Ceramic Multilayer Capacitor; 50VDC; 125degC; C0G Dielec; +/-5% SMD; Manufacturer: KEMET; Manufacturer Part Number: C1206C102J5GACTU; Capacitance: 1nF; Tolerance: 5%; Dielectric: NP0; Voltage Rating (DC): 50V; Temperature Coefficient: 30ppm/°C; Supplier 1: RSComponents; RoHS: Yes; Category: Ceramic Capacitors; Stock 1: 1825; Pricing 1: 25=0.20800, 250=0.10000, 625=0.06600, 1250=0.06300, 2500=0.05900 (USD); Mount: Surface Mount,PCB; Case/Package: 1206; Dielectric Material: Ceramic; Case Code (Metric): 3216; Case Code (Imperial): 1206; Contact Material: Tin; Contact Plating: Tin,Matte; Min Operating Temperature: -55°C; Max Operating Temperature: 125°C; Packaging: Tape and Reel; Voltage Rating: 50V; Package Quantity: 1; Series: C; Construction: Flat; Termination: SMD/SMT; Voltage: 50V; Length: 3.2mm; Width: 0.063inch; Height: 0.78mm; Depth: 1.6mm; Thickness: 0.035inch; Radiation Hardening: No; RoHS Compliant: Yes; Lead Free: Lead Free; REACH SVHC: No SVHC; ComponentLink1URL: https://datasheet.ciiva.com/145/docfinderpartnumber-c1206c102j5gactu-145681.pdf?src-supplier=Digi-Key; ComponentLink1Description: https://datasheet.ciiva.com/145/docfinderpartnumber-c1206c102j5gactu-145681.pdf?src-supplier=Digi-Key; ComponentLink2URL: https://datasheet.ciiva.com/7729/1691965-7729775.pdf?src-supplier=Element14; ComponentLink2Description: https://datasheet.ciiva.com/7729/1691965-7729775.pdf?src-supplier=Element14; ComponentLink3URL: https://datasheet.ciiva.com/28672/1789732-28672843.pdf?src-supplier=Element14; ComponentLink3Description: https://datasheet.ciiva.com/28672/1789732-28672843.pdf?src-supplier=Element14; ComponentLink4URL: https://datasheet.ciiva.com/14586/70095383-14586767.pdf?src-supplier=Allied+Electronics; ComponentLink4Description: https://datasheet.ciiva.com/14586/70095383-14586767.pdf?src-supplier=Allied+Electronics; ComponentLink5URL: https://datasheet.ciiva.com/14602/70095383-14602200.pdf?src-supplier=Allied+Electronics; ComponentLink5Description: https://datasheet.ciiva.com/14602/70095383-14602200.pdf?src-supplier=Allied+Electronics; ComponentLink6URL: https://datasheet.ciiva.com/11463/kem-c1003-c0g-smd-11463530.pdf?src-supplier=Avnet; ComponentLink6Description: https://datasheet.ciiva.com/11463/kem-c1003-c0g-smd-11463530.pdf?src-supplier=Avnet; ComponentLink7URL: https://datasheet.ciiva.com/2988/kem-c1003-c0g-smd-2988707.pdf?src-supplier=Avnet; ComponentLink7Description: https://datasheet.ciiva.com/2988/kem-c1003-c0g-smd-2988707.pdf?src-supplier=Avnet; ComponentLink8URL: https://datasheet.ciiva.com/18194/getdatasheetpartid-135192-18194074.pdf?src-supplier=Verical; ComponentLink8Description: https://datasheet.ciiva.com/18194/getdatasheetpartid-135192-18194074.pdf?src-supplier=Verical
footprint CAP1206
pins: 1, 2

## C1206C102J8HACAUTO
designator C?  Supplier Part Number 1: 80-C1206C102J8HAUTO
Cap Cer 1206 1NF 10V Ultra Stabl; Manufacturer: KEMET; Manufacturer Part Number: C1206C102J8HACAUTO; Supplier 1: Mouser; RoHS: Yes; Category: Ceramic Capacitors; Pricing 1: 1=0.19000, 10=0.13200, 50=0.13200, 100=0.06700, 1000=0.04100, 10000=0.03300 (USD); RoHS Compliant: Yes
footprint CAP1206
pins: 1, 2

## C1206C102K3RACTU
designator C?  Supplier Part Number 1: 82AC2530
Cap Ceramic 0.001uF 25V X7R 10% SMD 1206 125°C Plastic T/R; Manufacturer: KEMET; Manufacturer Part Number: C1206C102K3RACTU; Capacitance: 1nF; Supplier 1: Newark; RoHS: Yes; Category: Ceramic Capacitors; Stock 1: 1179; Pricing 1: 10=0.32100, 25=0.27500, 50=0.22900, 100=0.18300 (USD); Mount: Surface Mount; Case/Package: 1206; Dielectric Material: Ceramic; Case Code (Imperial): 1206; Case Code (Metric): 3216; Min Operating Temperature: -55°C; Max Operating Temperature: 125°C; Tolerance: 10%; Dielectric: X7R; Voltage Rating (DC): 25V; Packaging: Tape and Reel; Package Quantity: 4000; Termination: SMD/SMT; Construction: Flat; Voltage Rating: 25V; Series: C; Length: 3.2mm; Width: 0.063inch; Height: 0.78mm; Depth: 1.6mm; Thickness: 0.035inch; RoHS Compliant: Yes; ComponentLink1URL: http://www.mouser.com/ds/2/212/KEM_C1002_X7R_SMD-1102033.pdf?src-supplier=Mouser; ComponentLink1Description: http://www.mouser.com/ds/2/212/KEM_C1002_X7R_SMD-1102033.pdf?src-supplier=Mouser; ComponentLink2URL: http://components.arrow.com/part/dataview/3453827S9879660N7429?src-supplier=Arrow+Electronics; ComponentLink2Description: http://components.arrow.com/part/dataview/3453827S9879660N7429?src-supplier=Arrow+Electronics; ComponentLink3URL: http://www.kemet.com/docfinder?Partnumber=C1206C102K3RACTU&src-supplier=Digi-Key; ComponentLink3Description: http://www.kemet.com/docfinder?Partnumber=C1206C102K3RACTU&src-supplier=Digi-Key
footprint CAP1206
pins: 1, 2

## C1206C102K4RACTU
designator C?  Supplier Part Number 1: 96Y7234
Cap Ceramic 0.001uF 16V X7R 10% Pad SMD 1206 125C T/R; Manufacturer: KEMET; Manufacturer Part Number: C1206C102K4RACTU; Capacitance: 1nF; Dissipation Factor: 5%; Supplier 1: Newark; RoHS: Yes; Category: Ceramic Capacitors; Stock 1: 3630; Pricing 1: 1=0.01500, 25=0.01500, 50=0.01500, 100=0.01500, 250=0.01500, 500=0.01500 (USD); Mount: Surface Mount; Case/Package: 1206; Case Code (Metric): 3216; Case Code (Imperial): 1206; Dielectric Material: Ceramic; Min Operating Temperature: -55°C; Max Operating Temperature: 125°C; Voltage Rating: 16V; Tolerance: 10%; Packaging: Tape and Reel; Package Quantity: 1; Voltage Rating (DC): 16V; Dielectric: X7R; Termination: SMD/SMT; Series: C; Length: 3.2mm; Width: 0.063inch; Height: 0.78mm; Thickness: 0.035inch; Depth: 1.6mm; RoHS Compliant: Yes; ComponentLink1URL: https://datasheet.ciiva.com/5415/kem-c1002-x7r-smd-357932-5415526.pdf?src-supplier=Mouser; ComponentLink1Description: https://datasheet.ciiva.com/5415/kem-c1002-x7r-smd-357932-5415526.pdf?src-supplier=Mouser
footprint CAP1206
pins: 1, 2

## C1206C102K5RACTU
designator C?  Supplier Part Number 1: 6480783
Cap Ceramic 0.001uF 50V X7R 10% Pad SMD 1206 125°C T/R; Manufacturer: KEMET; Manufacturer Part Number: C1206C102K5RACTU; Capacitance: 1nF; Supplier 1: RSComponents; RoHS: Yes; Category: Ceramic Capacitors; Stock 1: 8040; Pricing 1: 10=0.12000, 100=0.06100, 500=0.04300, 1000=0.03400 (USD); Mount: Surface Mount; Case/Package: 1206; Number of Pins: 2; Dielectric Material: Ceramic; Case Code (Imperial): 1206; Case Code (Metric): 3216; Min Operating Temperature: -55°C; Max Operating Temperature: 125°C; Tolerance: 10%; Dielectric: X7R; Voltage Rating (DC): 50V; Packaging: Tape and Reel; Termination: SMD/SMT; Package Quantity: 1; Voltage Rating: 50V; Series: C; Construction: Flat; Voltage: 50V; Length: 3.2mm; Width: 1.6mm; Height: 0.78mm; Depth: 1.6mm; Thickness: 0.035inch; RoHS Compliant: Yes; REACH SVHC: No SVHC; ComponentLink1URL: https://datasheet.ciiva.com/28610/1918693-28610890.pdf?src-supplier=Element14; ComponentLink1Description: https://datasheet.ciiva.com/28610/1918693-28610890.pdf?src-supplier=Element14; ComponentLink2URL: https://datasheet.ciiva.com/45846/docfinderpartnumberc0402c102k5ractu-45846938.pdf?src-supplier=Onlinecomponents.com; ComponentLink2Description: https://datasheet.ciiva.com/45846/docfinderpartnumberc0402c102k5ractu-45846938.pdf?src-supplier=Onlinecomponents.com; ComponentLink3URL: https://datasheet.ciiva.com/39122/docfinderpartnumberc0402c102k5ractu-39122939.pdf?src-supplier=Onlinecomponents.com; ComponentLink3Description: https://datasheet.ciiva.com/39122/docfinderpartnumberc0402c102k5ractu-39122939.pdf?src-supplier=Onlinecomponents.com; ComponentLink4URL: https://datasheet.ciiva.com/5904/kem-c1002-x7r-smd-5904924.pdf?src-supplier=Farnell; ComponentLink4Description: https://datasheet.ciiva.com/5904/kem-c1002-x7r-smd-5904924.pdf?src-supplier=Farnell
footprint CAP1206
pins: 1, 2

## C1206C102K8HACAUTO
designator C?  Supplier Part Number 1: 80-C1206C102K8HAUTO
Cap Cer 1206 1NF 10V Ultra Stabl; Manufacturer: KEMET; Manufacturer Part Number: C1206C102K8HACAUTO; Supplier 1: Mouser; RoHS: Yes; Category: Ceramic Capacitors; Pricing 1: 1=0.22000, 10=0.15100, 50=0.15100, 100=0.07200, 1000=0.04200, 10000=0.03200 (USD); RoHS Compliant: Yes
footprint CAP1206
pins: 1, 2

## C1206C103J3RACTU
designator C?  Supplier Part Number 1: C1206C103J3RACTU
Cap Ceramic 0.01uF 25V X7R 5% SMD 1206 125°C Plastic T/R; Manufacturer: KEMET; Capacitance: 10nF; Supplier 1: Avnet; Manufacturer Part Number: C1206C103J3RACTU; RoHS: Yes; Category: Ceramic Capacitors; Stock 1: 4000; Pricing 1: 4000=0.10005, 8000=0.09833, 16000=0.09660, 24000=0.09488, 32000=0.09315, 40000=0.09143, 400000=0.08970 (USD); Mount: Surface Mount; Case/Package: 1206; Case Code (Metric): 3216; Case Code (Imperial): 1206; Dielectric Material: Ceramic; Min Operating Temperature: -55°C; Max Operating Temperature: 125°C; Tolerance: 5%; Voltage Rating (DC): 25V; Dielectric: X7R; Packaging: Tape and Reel; Voltage Rating: 25V; Termination: SMD/SMT; Series: C1206C; Package Quantity: 4000; Length: 0.126inch; Width: 0.063inch; Height: 0.78mm; Depth: 1.6mm; Thickness: 0.035inch; RoHS Compliant: Yes; ComponentLink1URL: http://www.mouser.com/ds/2/212/KEM_C1002_X7R_SMD-1102033.pdf?src-supplier=Mouser; ComponentLink1Description: http://www.mouser.com/ds/2/212/KEM_C1002_X7R_SMD-1102033.pdf?src-supplier=Mouser; ComponentLink2URL: http://components.arrow.com/part/dataview/3455932S8615909N7429?src-supplier=Arrow+Electronics; ComponentLink2Description: http://components.arrow.com/part/dataview/3455932S8615909N7429?src-supplier=Arrow+Electronics; ComponentLink3URL: https://search.kemet.com/component-edge/download/datasheet/C1206C103J3RACTU.pdf?src-supplier=Digi-Key; ComponentLink3Description: https://search.kemet.com/component-edge/download/datasheet/C1206C103J3RACTU.pdf?src-supplier=Digi-Key
footprint CAP1206
pins: 1, 2
